# Altium schematic symbol library jlcpcb_2025_04_capacitors_extended_0603.schlib: 3668 symbols (part 8 of 20) (continued)
## CC0603CRNPO9BN2R0
designator C?  Capacitance: 2pF  (hidden comment: *)
Capacitor, Ceramic (MLCC), 2pF, 50V, NP0, SMD 0603; Manufacturer: YAGEO; Manufacturer Part Number: CC0603CRNPO9BN2R0; Package Size: 0603; JLCPCB Basic Part: No; JLCPCB Part Number: C309462; Supplier 1: LCSC; Category: Capacitors - MLCC; Supplier Part Number 1: C309462; Voltage Rating: 50V; Temperature Coefficient: NP0; RoHS: Yes; ComponentLink1Description: Datasheet; ComponentLink1URL: https://wmsc.lcsc.com/wmsc/upload/file/pdf/v2/lcsc/2304140030_YAGEO-CC0603CRNPO9BN2R0_C309462.pdf; ComponentLink2Description: JLCPCB Part URL; ComponentLink2URL: https://jlcpcb.com/partdetail/C309462; ComponentLink3Description: LCSC Part URL; ComponentLink3URL: https://lcsc.com/product-detail/Multilayer-Ceramic-Capacitors-MLCC---SMD-SMT_YAGEO-YAGEO-CC0603CRNPO9BN2R0_C309462.html
footprint CAP-0603 (0603 (1608M) Capacitor)
pins: 1, 2

## CC0603CRNPO9BN2R2
designator C?  Capacitance: 2.2pF  (hidden comment: *)
Capacitor, Ceramic (MLCC), 2.2pF, 50V, NP0, SMD 0603; Manufacturer: YAGEO; Manufacturer Part Number: CC0603CRNPO9BN2R2; Package Size: 0603; JLCPCB Basic Part: No; JLCPCB Part Number: C282246; Supplier 1: LCSC; Category: Capacitors - MLCC; Supplier Part Number 1: C282246; Voltage Rating: 50V; Temperature Coefficient: NP0; RoHS: Yes; ComponentLink1Description: Datasheet; ComponentLink1URL: https://wmsc.lcsc.com/wmsc/upload/file/pdf/v2/lcsc/2304140030_YAGEO-CC0603CRNPO9BN2R2_C282246.pdf; ComponentLink2Description: JLCPCB Part URL; ComponentLink2URL: https://jlcpcb.com/partdetail/C282246; ComponentLink3Description: LCSC Part URL; ComponentLink3URL: https://lcsc.com/product-detail/Multilayer-Ceramic-Capacitors-MLCC---SMD-SMT_YAGEO-YAGEO-CC0603CRNPO9BN2R2_C282246.html
footprint CAP-0603 (0603 (1608M) Capacitor)
pins: 1, 2

## CC0603CRNPO9BN2R4
designator C?  Capacitance: 2.4pF  (hidden comment: *)
Capacitor, Ceramic (MLCC), 2.4pF, 50V, NP0, SMD 0603; Manufacturer: YAGEO; Manufacturer Part Number: CC0603CRNPO9BN2R4; Package Size: 0603; JLCPCB Basic Part: No; JLCPCB Part Number: C513705; Supplier 1: LCSC; Category: Capacitors - MLCC; Supplier Part Number 1: C513705; Voltage Rating: 50V; Temperature Coefficient: NP0; RoHS: Yes; ComponentLink1Description: Datasheet; ComponentLink1URL: https://wmsc.lcsc.com/wmsc/upload/file/pdf/v2/lcsc/2004231434_YAGEO-CC0603CRNPO9BN2R4_C513705.pdf; ComponentLink2Description: JLCPCB Part URL; ComponentLink2URL: https://jlcpcb.com/partdetail/C513705; ComponentLink3Description: LCSC Part URL; ComponentLink3URL: https://lcsc.com/product-detail/Multilayer-Ceramic-Capacitors-MLCC---SMD-SMT_YAGEO-YAGEO-CC0603CRNPO9BN2R4_C513705.html
footprint CAP-0603 (0603 (1608M) Capacitor)
pins: 1, 2

## CC0603CRNPO9BN2R5
designator C?  Capacitance: 2.5pF  (hidden comment: *)
Capacitor, Ceramic (MLCC), 2.5pF, 50V, NP0, SMD 0603; Manufacturer: YAGEO; Manufacturer Part Number: CC0603CRNPO9BN2R5; Package Size: 0603; JLCPCB Basic Part: No; JLCPCB Part Number: C327232; Supplier 1: LCSC; Category: Capacitors - MLCC; Supplier Part Number 1: C327232; Voltage Rating: 50V; Temperature Coefficient: NP0; RoHS: Yes; ComponentLink1Description: Datasheet; ComponentLink1URL: https://wmsc.lcsc.com/wmsc/upload/file/pdf/v2/lcsc/1811141242_YAGEO-CC0603CRNPO9BN2R5_C327232.pdf; ComponentLink2Description: JLCPCB Part URL; ComponentLink2URL: https://jlcpcb.com/partdetail/C327232; ComponentLink3Description: LCSC Part URL; ComponentLink3URL: https://lcsc.com/product-detail/Multilayer-Ceramic-Capacitors-MLCC---SMD-SMT_YAGEO-YAGEO-CC0603CRNPO9BN2R5_C327232.html
footprint CAP-0603 (0603 (1608M) Capacitor)
pins: 1, 2

## CC0603CRNPO9BN2R7
designator C?  Capacitance: 2.7pF  (hidden comment: *)
Capacitor, Ceramic (MLCC), 2.7pF, 50V, NP0, SMD 0603; Manufacturer: YAGEO; Manufacturer Part Number: CC0603CRNPO9BN2R7; Package Size: 0603; JLCPCB Basic Part: No; JLCPCB Part Number: C282247; Supplier 1: LCSC; Category: Capacitors - MLCC; Supplier Part Number 1: C282247; Voltage Rating: 50V; Temperature Coefficient: NP0; RoHS: Yes; ComponentLink1Description: Datasheet; ComponentLink1URL: https://wmsc.lcsc.com/wmsc/upload/file/pdf/v2/lcsc/2304140030_YAGEO-CC0603CRNPO9BN2R7_C282247.pdf; ComponentLink2Description: JLCPCB Part URL; ComponentLink2URL: https://jlcpcb.com/partdetail/C282247; ComponentLink3Description: LCSC Part URL; ComponentLink3URL: https://lcsc.com/product-detail/Multilayer-Ceramic-Capacitors-MLCC---SMD-SMT_YAGEO-YAGEO-CC0603CRNPO9BN2R7_C282247.html
footprint CAP-0603 (0603 (1608M) Capacitor)
pins: 1, 2

## CC0603CRNPO9BN3R0
designator C?  Capacitance: 3pF  (hidden comment: *)
Capacitor, Ceramic (MLCC), 3pF, 50V, NP0, SMD 0603; Manufacturer: YAGEO; Manufacturer Part Number: CC0603CRNPO9BN3R0; Package Size: 0603; JLCPCB Basic Part: No; JLCPCB Part Number: C282068; Supplier 1: LCSC; Category: Capacitors - MLCC; Supplier Part Number 1: C282068; Voltage Rating: 50V; Temperature Coefficient: NP0; RoHS: Yes; ComponentLink1Description: Datasheet; ComponentLink1URL: https://wmsc.lcsc.com/wmsc/upload/file/pdf/v2/lcsc/2304140030_YAGEO-CC0603CRNPO9BN3R0_C282068.pdf; ComponentLink2Description: JLCPCB Part URL; ComponentLink2URL: https://jlcpcb.com/partdetail/C282068; ComponentLink3Description: LCSC Part URL; ComponentLink3URL: https://lcsc.com/product-detail/Multilayer-Ceramic-Capacitors-MLCC---SMD-SMT_YAGEO-YAGEO-CC0603CRNPO9BN3R0_C282068.html
footprint CAP-0603 (0603 (1608M) Capacitor)
pins: 1, 2

## CC0603CRNPO9BN3R3
designator C?  Capacitance: 3.3pF  (hidden comment: *)
Capacitor, Ceramic (MLCC), 3.3pF, 50V, NP0, SMD 0603; Manufacturer: YAGEO; Manufacturer Part Number: CC0603CRNPO9BN3R3; Package Size: 0603; JLCPCB Basic Part: No; JLCPCB Part Number: C282249; Supplier 1: LCSC; Category: Capacitors - MLCC; Supplier Part Number 1: C282249; Voltage Rating: 50V; Temperature Coefficient: NP0; RoHS: Yes; ComponentLink1Description: Datasheet; ComponentLink1URL: https://wmsc.lcsc.com/wmsc/upload/file/pdf/v2/lcsc/2304140030_YAGEO-CC0603CRNPO9BN3R3_C282249.pdf; ComponentLink2Description: JLCPCB Part URL; ComponentLink2URL: https://jlcpcb.com/partdetail/C282249; ComponentLink3Description: LCSC Part URL; ComponentLink3URL: https://lcsc.com/product-detail/Multilayer-Ceramic-Capacitors-MLCC---SMD-SMT_YAGEO-YAGEO-CC0603CRNPO9BN3R3_C282249.html
footprint CAP-0603 (0603 (1608M) Capacitor)
pins: 1, 2

## CC0603CRNPO9BN3R5
designator C?  Capacitance: 3.5pF  (hidden comment: *)
Capacitor, Ceramic (MLCC), 3.5pF, 50V, NP0, SMD 0603; Manufacturer: YAGEO; Manufacturer Part Number: CC0603CRNPO9BN3R5; Package Size: 0603; JLCPCB Basic Part: No; JLCPCB Part Number: C519374; Supplier 1: LCSC; Category: Capacitors - MLCC; Supplier Part Number 1: C519374; Voltage Rating: 50V; Temperature Coefficient: NP0; RoHS: Yes; ComponentLink1Description: Datasheet; ComponentLink1URL: https://wmsc.lcsc.com/wmsc/upload/file/pdf/v2/lcsc/2006011834_YAGEO-CC0603CRNPO9BN3R5_C519374.pdf; ComponentLink2Description: JLCPCB Part URL; ComponentLink2URL: https://jlcpcb.com/partdetail/C519374; ComponentLink3Description: LCSC Part URL; ComponentLink3URL: https://lcsc.com/product-detail/Multilayer-Ceramic-Capacitors-MLCC---SMD-SMT_YAGEO-YAGEO-CC0603CRNPO9BN3R5_C519374.html
footprint CAP-0603 (0603 (1608M) Capacitor)
pins: 1, 2

## CC0603CRNPO9BN3R6
designator C?  Capacitance: 3.6pF  (hidden comment: *)
Capacitor, Ceramic (MLCC), 3.6pF, 50V, NP0, SMD 0603; Manufacturer: YAGEO; Manufacturer Part Number: CC0603CRNPO9BN3R6; Package Size: 0603; JLCPCB Basic Part: No; JLCPCB Part Number: C309463; Supplier 1: LCSC; Category: Capacitors - MLCC; Supplier Part Number 1: C309463; Voltage Rating: 50V; Temperature Coefficient: NP0; RoHS: Yes; ComponentLink1Description: Datasheet; ComponentLink1URL: https://wmsc.lcsc.com/wmsc/upload/file/pdf/v2/lcsc/2304140030_YAGEO-CC0603CRNPO9BN3R6_C309463.pdf; ComponentLink2Description: JLCPCB Part URL; ComponentLink2URL: https://jlcpcb.com/partdetail/C309463; ComponentLink3Description: LCSC Part URL; ComponentLink3URL: https://lcsc.com/product-detail/Multilayer-Ceramic-Capacitors-MLCC---SMD-SMT_YAGEO-YAGEO-CC0603CRNPO9BN3R6_C309463.html
footprint CAP-0603 (0603 (1608M) Capacitor)
pins: 1, 2

## CC0603CRNPO9BN3R9
designator C?  Capacitance: 3.9pF  (hidden comment: *)
Capacitor, Ceramic (MLCC), 3.9pF, 50V, NP0, SMD 0603; Manufacturer: YAGEO; Manufacturer Part Number: CC0603CRNPO9BN3R9; Package Size: 0603; JLCPCB Basic Part: No; JLCPCB Part Number: C282250; Supplier 1: LCSC; Category: Capacitors - MLCC; Supplier Part Number 1: C282250; Voltage Rating: 50V; Temperature Coefficient: NP0; RoHS: Yes; ComponentLink1Description: Datasheet; ComponentLink1URL: https://wmsc.lcsc.com/wmsc/upload/file/pdf/v2/lcsc/2304140030_YAGEO-CC0603CRNPO9BN3R9_C282250.pdf; ComponentLink2Description: JLCPCB Part URL; ComponentLink2URL: https://jlcpcb.com/partdetail/C282250; ComponentLink3Description: LCSC Part URL; ComponentLink3URL: https://lcsc.com/product-detail/Multilayer-Ceramic-Capacitors-MLCC---SMD-SMT_YAGEO-YAGEO-CC0603CRNPO9BN3R9_C282250.html
footprint CAP-0603 (0603 (1608M) Capacitor)
pins: 1, 2

## CC0603CRNPO9BN4R0
designator C?  Capacitance: 4pF  (hidden comment: *)
Capacitor, Ceramic (MLCC), 4pF, 50V, NP0, SMD 0603; Manufacturer: YAGEO; Manufacturer Part Number: CC0603CRNPO9BN4R0; Package Size: 0603; JLCPCB Basic Part: No; JLCPCB Part Number: C130123; Supplier 1: LCSC; Category: Capacitors - MLCC; Supplier Part Number 1: C130123; Voltage Rating: 50V; Temperature Coefficient: NP0; RoHS: Yes; ComponentLink1Description: Datasheet; ComponentLink1URL: https://wmsc.lcsc.com/wmsc/upload/file/pdf/v2/lcsc/2304140030_YAGEO-CC0603CRNPO9BN4R0_C130123.pdf; ComponentLink2Description: JLCPCB Part URL; ComponentLink2URL: https://jlcpcb.com/partdetail/C130123; ComponentLink3Description: LCSC Part URL; ComponentLink3URL: https://lcsc.com/product-detail/Multilayer-Ceramic-Capacitors-MLCC---SMD-SMT_YAGEO-YAGEO-CC0603CRNPO9BN4R0_C130123.html
footprint CAP-0603 (0603 (1608M) Capacitor)
pins: 1, 2

## CC0603CRNPO9BN4R3
designator C?  Capacitance: 4.3pF  (hidden comment: *)
Capacitor, Ceramic (MLCC), 4.3pF, 50V, NP0, SMD 0603; Manufacturer: YAGEO; Manufacturer Part Number: CC0603CRNPO9BN4R3; Package Size: 0603; JLCPCB Basic Part: No; JLCPCB Part Number: C519375; Supplier 1: LCSC; Category: Capacitors - MLCC; Supplier Part Number 1: C519375; Voltage Rating: 50V; Temperature Coefficient: NP0; RoHS: Yes; ComponentLink1Description: Datasheet; ComponentLink1URL: https://wmsc.lcsc.com/wmsc/upload/file/pdf/v2/lcsc/2008031233_YAGEO-CC0603CRNPO9BN4R3_C519375.pdf; ComponentLink2Description: JLCPCB Part URL; ComponentLink2URL: https://jlcpcb.com/partdetail/C519375; ComponentLink3Description: LCSC Part URL; ComponentLink3URL: https://lcsc.com/product-detail/Multilayer-Ceramic-Capacitors-MLCC---SMD-SMT_YAGEO-YAGEO-CC0603CRNPO9BN4R3_C519375.html
footprint CAP-0603 (0603 (1608M) Capacitor)
pins: 1, 2

## CC0603CRNPO9BN4R7
designator C?  Capacitance: 4.7pF  (hidden comment: *)
Capacitor, Ceramic (MLCC), 4.7pF, 50V, NP0, SMD 0603; Manufacturer: YAGEO; Manufacturer Part Number: CC0603CRNPO9BN4R7; Package Size: 0603; JLCPCB Basic Part: No; JLCPCB Part Number: C282071; Supplier 1: LCSC; Category: Capacitors - MLCC; Supplier Part Number 1: C282071; Voltage Rating: 50V; Temperature Coefficient: NP0; RoHS: Yes; ComponentLink1Description: Datasheet; ComponentLink1URL: https://wmsc.lcsc.com/wmsc/upload/file/pdf/v2/lcsc/2304140030_YAGEO-CC0603CRNPO9BN4R7_C282071.pdf; ComponentLink2Description: JLCPCB Part URL; ComponentLink2URL: https://jlcpcb.com/partdetail/C282071; ComponentLink3Description: LCSC Part URL; ComponentLink3URL: https://lcsc.com/product-detail/Multilayer-Ceramic-Capacitors-MLCC---SMD-SMT_YAGEO-YAGEO-CC0603CRNPO9BN4R7_C282071.html
footprint CAP-0603 (0603 (1608M) Capacitor)
pins: 1, 2

## CC0603CRNPO9BN5R0
designator C?  Capacitance: 5pF  (hidden comment: *)
Capacitor, Ceramic (MLCC), 5pF, 50V, NP0, SMD 0603; Manufacturer: YAGEO; Manufacturer Part Number: CC0603CRNPO9BN5R0; Package Size: 0603; JLCPCB Basic Part: No; JLCPCB Part Number: C327203; Supplier 1: LCSC; Category: Capacitors - MLCC; Supplier Part Number 1: C327203; Voltage Rating: 50V; Temperature Coefficient: NP0; RoHS: Yes; ComponentLink1Description: Datasheet; ComponentLink1URL: https://wmsc.lcsc.com/wmsc/upload/file/pdf/v2/lcsc/1811141233_YAGEO-CC0603CRNPO9BN5R0_C327203.pdf; ComponentLink2Description: JLCPCB Part URL; ComponentLink2URL: https://jlcpcb.com/partdetail/C327203; ComponentLink3Description: LCSC Part URL; ComponentLink3URL: https://lcsc.com/product-detail/Multilayer-Ceramic-Capacitors-MLCC---SMD-SMT_YAGEO-YAGEO-CC0603CRNPO9BN5R0_C327203.html
footprint CAP-0603 (0603 (1608M) Capacitor)
pins: 1, 2

## CC0603CRNPO9BN5R1
designator C?  Capacitance: 5.1pF  (hidden comment: *)
Capacitor, Ceramic (MLCC), 5.1pF, 50V, NP0, SMD 0603; Manufacturer: YAGEO; Manufacturer Part Number: CC0603CRNPO9BN5R1; Package Size: 0603; JLCPCB Basic Part: No; JLCPCB Part Number: C519376; Supplier 1: LCSC; Category: Capacitors - MLCC; Supplier Part Number 1: C519376; Voltage Rating: 50V; Temperature Coefficient: NP0; RoHS: Yes; ComponentLink1Description: Datasheet; ComponentLink1URL: https://wmsc.lcsc.com/wmsc/upload/file/pdf/v2/lcsc/2005141203_YAGEO-CC0603CRNPO9BN5R1_C519376.pdf; ComponentLink2Description: JLCPCB Part URL; ComponentLink2URL: https://jlcpcb.com/partdetail/C519376; ComponentLink3Description: LCSC Part URL; ComponentLink3URL: https://lcsc.com/product-detail/Multilayer-Ceramic-Capacitors-MLCC---SMD-SMT_YAGEO-YAGEO-CC0603CRNPO9BN5R1_C519376.html
footprint CAP-0603 (0603 (1608M) Capacitor)
pins: 1, 2

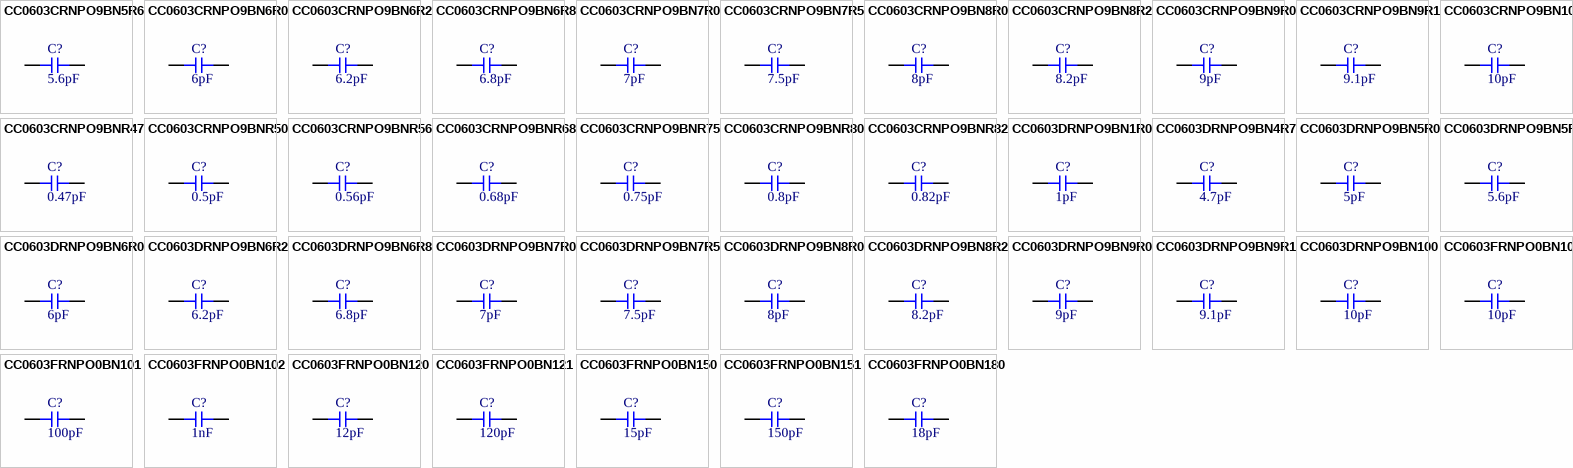
[diagram p35: symbols CC0603CRNPO9BN5R6 to CC0603FRNPO0BN180]

## CC0603CRNPO9BN5R6
designator C?  Capacitance: 5.6pF  (hidden comment: *)
Capacitor, Ceramic (MLCC), 5.6pF, 50V, NP0, SMD 0603; Manufacturer: YAGEO; Manufacturer Part Number: CC0603CRNPO9BN5R6; Package Size: 0603; JLCPCB Basic Part: No; JLCPCB Part Number: C309464; Supplier 1: LCSC; Category: Capacitors - MLCC; Supplier Part Number 1: C309464; Voltage Rating: 50V; Temperature Coefficient: NP0; RoHS: Yes; ComponentLink1Description: Datasheet; ComponentLink1URL: https://wmsc.lcsc.com/wmsc/upload/file/pdf/v2/lcsc/2304140030_YAGEO-CC0603CRNPO9BN5R6_C309464.pdf; ComponentLink2Description: JLCPCB Part URL; ComponentLink2URL: https://jlcpcb.com/partdetail/C309464; ComponentLink3Description: LCSC Part URL; ComponentLink3URL: https://lcsc.com/product-detail/Multilayer-Ceramic-Capacitors-MLCC---SMD-SMT_YAGEO-YAGEO-CC0603CRNPO9BN5R6_C309464.html
footprint CAP-0603 (0603 (1608M) Capacitor)
pins: 1, 2

## CC0603CRNPO9BN6R0
designator C?  Capacitance: 6pF  (hidden comment: *)
Capacitor, Ceramic (MLCC), 6pF, 50V, NP0, SMD 0603; Manufacturer: YAGEO; Manufacturer Part Number: CC0603CRNPO9BN6R0; Package Size: 0603; JLCPCB Basic Part: No; JLCPCB Part Number: C130125; Supplier 1: LCSC; Category: Capacitors - MLCC; Supplier Part Number 1: C130125; Voltage Rating: 50V; Temperature Coefficient: NP0; RoHS: Yes; ComponentLink1Description: Datasheet; ComponentLink1URL: https://wmsc.lcsc.com/wmsc/upload/file/pdf/v2/lcsc/2304140030_YAGEO-CC0603CRNPO9BN6R0_C130125.pdf; ComponentLink2Description: JLCPCB Part URL; ComponentLink2URL: https://jlcpcb.com/partdetail/C130125; ComponentLink3Description: LCSC Part URL; ComponentLink3URL: https://lcsc.com/product-detail/Multilayer-Ceramic-Capacitors-MLCC---SMD-SMT_YAGEO-YAGEO-CC0603CRNPO9BN6R0_C130125.html
footprint CAP-0603 (0603 (1608M) Capacitor)
pins: 1, 2

## CC0603CRNPO9BN6R2
designator C?  Capacitance: 6.2pF  (hidden comment: *)
Capacitor, Ceramic (MLCC), 6.2pF, 50V, NP0, SMD 0603; Manufacturer: YAGEO; Manufacturer Part Number: CC0603CRNPO9BN6R2; Package Size: 0603; JLCPCB Basic Part: No; JLCPCB Part Number: C327317; Supplier 1: LCSC; Category: Capacitors - MLCC; Supplier Part Number 1: C327317; Voltage Rating: 50V; Temperature Coefficient: NP0; RoHS: Yes; ComponentLink1Description: Datasheet; ComponentLink1URL: https://wmsc.lcsc.com/wmsc/upload/file/pdf/v2/lcsc/1811141225_YAGEO-CC0603CRNPO9BN6R2_C327317.pdf; ComponentLink2Description: JLCPCB Part URL; ComponentLink2URL: https://jlcpcb.com/partdetail/C327317; ComponentLink3Description: LCSC Part URL; ComponentLink3URL: https://lcsc.com/product-detail/Multilayer-Ceramic-Capacitors-MLCC---SMD-SMT_YAGEO-YAGEO-CC0603CRNPO9BN6R2_C327317.html
footprint CAP-0603 (0603 (1608M) Capacitor)
pins: 1, 2

## CC0603CRNPO9BN6R8
designator C?  Capacitance: 6.8pF  (hidden comment: *)
Capacitor, Ceramic (MLCC), 6.8pF, 50V, NP0, SMD 0603; Manufacturer: YAGEO; Manufacturer Part Number: CC0603CRNPO9BN6R8; Package Size: 0603; JLCPCB Basic Part: No; JLCPCB Part Number: C282251; Supplier 1: LCSC; Category: Capacitors - MLCC; Supplier Part Number 1: C282251; Voltage Rating: 50V; Temperature Coefficient: NP0; RoHS: Yes; ComponentLink1Description: Datasheet; ComponentLink1URL: https://wmsc.lcsc.com/wmsc/upload/file/pdf/v2/lcsc/2304140030_YAGEO-CC0603CRNPO9BN6R8_C282251.pdf; ComponentLink2Description: JLCPCB Part URL; ComponentLink2URL: https://jlcpcb.com/partdetail/C282251; ComponentLink3Description: LCSC Part URL; ComponentLink3URL: https://lcsc.com/product-detail/Multilayer-Ceramic-Capacitors-MLCC---SMD-SMT_YAGEO-YAGEO-CC0603CRNPO9BN6R8_C282251.html
footprint CAP-0603 (0603 (1608M) Capacitor)
pins: 1, 2

## CC0603CRNPO9BN7R0
designator C?  Capacitance: 7pF  (hidden comment: *)
Capacitor, Ceramic (MLCC), 7pF, 50V, NP0, SMD 0603; Manufacturer: YAGEO; Manufacturer Part Number: CC0603CRNPO9BN7R0; Package Size: 0603; JLCPCB Basic Part: No; JLCPCB Part Number: C326971; Supplier 1: LCSC; Category: Capacitors - MLCC; Supplier Part Number 1: C326971; Voltage Rating: 50V; Temperature Coefficient: NP0; RoHS: Yes; ComponentLink1Description: Datasheet; ComponentLink1URL: https://wmsc.lcsc.com/wmsc/upload/file/pdf/v2/lcsc/1811141234_YAGEO-CC0603CRNPO9BN7R0_C326971.pdf; ComponentLink2Description: JLCPCB Part URL; ComponentLink2URL: https://jlcpcb.com/partdetail/C326971; ComponentLink3Description: LCSC Part URL; ComponentLink3URL: https://lcsc.com/product-detail/Multilayer-Ceramic-Capacitors-MLCC---SMD-SMT_YAGEO-YAGEO-CC0603CRNPO9BN7R0_C326971.html
footprint CAP-0603 (0603 (1608M) Capacitor)
pins: 1, 2

## CC0603CRNPO9BN7R5
designator C?  Capacitance: 7.5pF  (hidden comment: *)
Capacitor, Ceramic (MLCC), 7.5pF, 50V, NP0, SMD 0603; Manufacturer: YAGEO; Manufacturer Part Number: CC0603CRNPO9BN7R5; Package Size: 0603; JLCPCB Basic Part: No; JLCPCB Part Number: C519377; Supplier 1: LCSC; Category: Capacitors - MLCC; Supplier Part Number 1: C519377; Voltage Rating: 50V; Temperature Coefficient: NP0; RoHS: Yes; ComponentLink1Description: Datasheet; ComponentLink1URL: https://wmsc.lcsc.com/wmsc/upload/file/pdf/v2/lcsc/2006011834_YAGEO-CC0603CRNPO9BN7R5_C519377.pdf; ComponentLink2Description: JLCPCB Part URL; ComponentLink2URL: https://jlcpcb.com/partdetail/C519377; ComponentLink3Description: LCSC Part URL; ComponentLink3URL: https://lcsc.com/product-detail/Multilayer-Ceramic-Capacitors-MLCC---SMD-SMT_YAGEO-YAGEO-CC0603CRNPO9BN7R5_C519377.html
footprint CAP-0603 (0603 (1608M) Capacitor)
pins: 1, 2

## CC0603CRNPO9BN8R0
designator C?  Capacitance: 8pF  (hidden comment: *)
Capacitor, Ceramic (MLCC), 8pF, 50V, NP0, SMD 0603; Manufacturer: YAGEO; Manufacturer Part Number: CC0603CRNPO9BN8R0; Package Size: 0603; JLCPCB Basic Part: No; JLCPCB Part Number: C327316; Supplier 1: LCSC; Category: Capacitors - MLCC; Supplier Part Number 1: C327316; Voltage Rating: 50V; Temperature Coefficient: NP0; RoHS: Yes; ComponentLink1Description: Datasheet; ComponentLink1URL: https://wmsc.lcsc.com/wmsc/upload/file/pdf/v2/lcsc/1811141242_YAGEO-CC0603CRNPO9BN8R0_C327316.pdf; ComponentLink2Description: JLCPCB Part URL; ComponentLink2URL: https://jlcpcb.com/partdetail/C327316; ComponentLink3Description: LCSC Part URL; ComponentLink3URL: https://lcsc.com/product-detail/Multilayer-Ceramic-Capacitors-MLCC---SMD-SMT_YAGEO-YAGEO-CC0603CRNPO9BN8R0_C327316.html
footprint CAP-0603 (0603 (1608M) Capacitor)
pins: 1, 2

## CC0603CRNPO9BN8R2
designator C?  Capacitance: 8.2pF  (hidden comment: *)
Capacitor, Ceramic (MLCC), 8.2pF, 50V, NP0, SMD 0603; Manufacturer: YAGEO; Manufacturer Part Number: CC0603CRNPO9BN8R2; Package Size: 0603; JLCPCB Basic Part: No; JLCPCB Part Number: C277519; Supplier 1: LCSC; Category: Capacitors - MLCC; Supplier Part Number 1: C277519; Voltage Rating: 50V; Temperature Coefficient: NP0; RoHS: Yes; ComponentLink1Description: Datasheet; ComponentLink1URL: https://wmsc.lcsc.com/wmsc/upload/file/pdf/v2/lcsc/2304140030_YAGEO-CC0603CRNPO9BN8R2_C277519.pdf; ComponentLink2Description: JLCPCB Part URL; ComponentLink2URL: https://jlcpcb.com/partdetail/C277519; ComponentLink3Description: LCSC Part URL; ComponentLink3URL: https://lcsc.com/product-detail/Multilayer-Ceramic-Capacitors-MLCC---SMD-SMT_YAGEO-YAGEO-CC0603CRNPO9BN8R2_C277519.html
footprint CAP-0603 (0603 (1608M) Capacitor)
pins: 1, 2

## CC0603CRNPO9BN9R0
designator C?  Capacitance: 9pF  (hidden comment: *)
Capacitor, Ceramic (MLCC), 9pF, 50V, NP0, SMD 0603; Manufacturer: YAGEO; Manufacturer Part Number: CC0603CRNPO9BN9R0; Package Size: 0603; JLCPCB Basic Part: No; JLCPCB Part Number: C282076; Supplier 1: LCSC; Category: Capacitors - MLCC; Supplier Part Number 1: C282076; Voltage Rating: 50V; Temperature Coefficient: NP0; RoHS: Yes; ComponentLink1Description: Datasheet; ComponentLink1URL: https://wmsc.lcsc.com/wmsc/upload/file/pdf/v2/lcsc/2304140030_YAGEO-CC0603CRNPO9BN9R0_C282076.pdf; ComponentLink2Description: JLCPCB Part URL; ComponentLink2URL: https://jlcpcb.com/partdetail/C282076; ComponentLink3Description: LCSC Part URL; ComponentLink3URL: https://lcsc.com/product-detail/Multilayer-Ceramic-Capacitors-MLCC---SMD-SMT_YAGEO-YAGEO-CC0603CRNPO9BN9R0_C282076.html
footprint CAP-0603 (0603 (1608M) Capacitor)
pins: 1, 2

## CC0603CRNPO9BN9R1
designator C?  Capacitance: 9.1pF  (hidden comment: *)
Capacitor, Ceramic (MLCC), 9.1pF, 50V, NP0, SMD 0603; Manufacturer: YAGEO; Manufacturer Part Number: CC0603CRNPO9BN9R1; Package Size: 0603; JLCPCB Basic Part: No; JLCPCB Part Number: C513588; Supplier 1: LCSC; Category: Capacitors - MLCC; Supplier Part Number 1: C513588; Voltage Rating: 50V; Temperature Coefficient: NP0; RoHS: Yes; ComponentLink1Description: Datasheet; ComponentLink1URL: https://wmsc.lcsc.com/wmsc/upload/file/pdf/v2/lcsc/2004231433_YAGEO-CC0603CRNPO9BN9R1_C513588.pdf; ComponentLink2Description: JLCPCB Part URL; ComponentLink2URL: https://jlcpcb.com/partdetail/C513588; ComponentLink3Description: LCSC Part URL; ComponentLink3URL: https://lcsc.com/product-detail/Multilayer-Ceramic-Capacitors-MLCC---SMD-SMT_YAGEO-YAGEO-CC0603CRNPO9BN9R1_C513588.html
footprint CAP-0603 (0603 (1608M) Capacitor)
pins: 1, 2

## CC0603CRNPO9BN100
designator C?  Capacitance: 10pF  (hidden comment: *)
Capacitor, Ceramic (MLCC), 10pF, 50V, NP0, SMD 0603; Manufacturer: YAGEO; Manufacturer Part Number: CC0603CRNPO9BN100; Package Size: 0603; JLCPCB Basic Part: No; JLCPCB Part Number: C513561; Supplier 1: LCSC; Category: Capacitors - MLCC; Supplier Part Number 1: C513561; Voltage Rating: 50V; Temperature Coefficient: NP0; RoHS: Yes; ComponentLink1Description: Datasheet; ComponentLink1URL: https://wmsc.lcsc.com/wmsc/upload/file/pdf/v2/lcsc/2202251630_YAGEO-CC0603CRNPO9BN100_C513561.pdf; ComponentLink2Description: JLCPCB Part URL; ComponentLink2URL: https://jlcpcb.com/partdetail/C513561; ComponentLink3Description: LCSC Part URL; ComponentLink3URL: https://lcsc.com/product-detail/Multilayer-Ceramic-Capacitors-MLCC---SMD-SMT_YAGEO-YAGEO-CC0603CRNPO9BN100_C513561.html
footprint CAP-0603 (0603 (1608M) Capacitor)
pins: 1, 2

## CC0603CRNPO9BNR47
designator C?  Capacitance: 0.47pF  (hidden comment: *)
Capacitor, Ceramic (MLCC), 0.47pF, 50V, NP0, SMD 0603; Manufacturer: YAGEO; Manufacturer Part Number: CC0603CRNPO9BNR47; Package Size: 0603; JLCPCB Basic Part: No; JLCPCB Part Number: C519378; Supplier 1: LCSC; Category: Capacitors - MLCC; Supplier Part Number 1: C519378; Voltage Rating: 50V; Temperature Coefficient: NP0; RoHS: Yes; ComponentLink1Description: Datasheet; ComponentLink1URL: https://wmsc.lcsc.com/wmsc/upload/file/pdf/v2/lcsc/2006011834_YAGEO-CC0603CRNPO9BNR47_C519378.pdf; ComponentLink2Description: JLCPCB Part URL; ComponentLink2URL: https://jlcpcb.com/partdetail/C519378; ComponentLink3Description: LCSC Part URL; ComponentLink3URL: https://lcsc.com/product-detail/Multilayer-Ceramic-Capacitors-MLCC---SMD-SMT_YAGEO-YAGEO-CC0603CRNPO9BNR47_C519378.html
footprint CAP-0603 (0603 (1608M) Capacitor)
pins: 1, 2

## CC0603CRNPO9BNR50
designator C?  Capacitance: 0.5pF  (hidden comment: *)
Capacitor, Ceramic (MLCC), 0.5pF, 50V, NP0, SMD 0603; Manufacturer: YAGEO; Manufacturer Part Number: CC0603CRNPO9BNR50; Package Size: 0603; JLCPCB Basic Part: No; JLCPCB Part Number: C134255; Supplier 1: LCSC; Category: Capacitors - MLCC; Supplier Part Number 1: C134255; Voltage Rating: 50V; Temperature Coefficient: NP0; RoHS: Yes; ComponentLink1Description: Datasheet; ComponentLink1URL: https://wmsc.lcsc.com/wmsc/upload/file/pdf/v2/lcsc/2304140030_YAGEO-CC0603CRNPO9BNR50_C134255.pdf; ComponentLink2Description: JLCPCB Part URL; ComponentLink2URL: https://jlcpcb.com/partdetail/C134255; ComponentLink3Description: LCSC Part URL; ComponentLink3URL: https://lcsc.com/product-detail/Multilayer-Ceramic-Capacitors-MLCC---SMD-SMT_YAGEO-YAGEO-CC0603CRNPO9BNR50_C134255.html
footprint CAP-0603 (0603 (1608M) Capacitor)
pins: 1, 2

## CC0603CRNPO9BNR56
designator C?  Capacitance: 0.56pF  (hidden comment: *)
Capacitor, Ceramic (MLCC), 0.56pF, 50V, NP0, SMD 0603; Manufacturer: YAGEO; Manufacturer Part Number: CC0603CRNPO9BNR56; Package Size: 0603; JLCPCB Basic Part: No; JLCPCB Part Number: C519379; Supplier 1: LCSC; Category: Capacitors - MLCC; Supplier Part Number 1: C519379; Voltage Rating: 50V; Temperature Coefficient: NP0; RoHS: Yes; ComponentLink1Description: Datasheet; ComponentLink1URL: https://wmsc.lcsc.com/wmsc/upload/file/pdf/v2/lcsc/2006011834_YAGEO-CC0603CRNPO9BNR56_C519379.pdf; ComponentLink2Description: JLCPCB Part URL; ComponentLink2URL: https://jlcpcb.com/partdetail/C519379; ComponentLink3Description: LCSC Part URL; ComponentLink3URL: https://lcsc.com/product-detail/Multilayer-Ceramic-Capacitors-MLCC---SMD-SMT_YAGEO-YAGEO-CC0603CRNPO9BNR56_C519379.html
footprint CAP-0603 (0603 (1608M) Capacitor)
pins: 1, 2

## CC0603CRNPO9BNR68
designator C?  Capacitance: 0.68pF  (hidden comment: *)
Capacitor, Ceramic (MLCC), 0.68pF, 50V, NP0, SMD 0603; Manufacturer: YAGEO; Manufacturer Part Number: CC0603CRNPO9BNR68; Package Size: 0603; JLCPCB Basic Part: No; JLCPCB Part Number: C519380; Supplier 1: LCSC; Category: Capacitors - MLCC; Supplier Part Number 1: C519380; Voltage Rating: 50V; Temperature Coefficient: NP0; RoHS: Yes; ComponentLink1Description: Datasheet; ComponentLink1URL: https://wmsc.lcsc.com/wmsc/upload/file/pdf/v2/lcsc/2007231533_YAGEO-CC0603CRNPO9BNR68_C519380.pdf; ComponentLink2Description: JLCPCB Part URL; ComponentLink2URL: https://jlcpcb.com/partdetail/C519380; ComponentLink3Description: LCSC Part URL; ComponentLink3URL: https://lcsc.com/product-detail/Multilayer-Ceramic-Capacitors-MLCC---SMD-SMT_YAGEO-YAGEO-CC0603CRNPO9BNR68_C519380.html
footprint CAP-0603 (0603 (1608M) Capacitor)
pins: 1, 2

## CC0603CRNPO9BNR75
designator C?  Capacitance: 0.75pF  (hidden comment: *)
Capacitor, Ceramic (MLCC), 0.75pF, 50V, NP0, SMD 0603; Manufacturer: YAGEO; Manufacturer Part Number: CC0603CRNPO9BNR75; Package Size: 0603; JLCPCB Basic Part: No; JLCPCB Part Number: C309465; Supplier 1: LCSC; Category: Capacitors - MLCC; Supplier Part Number 1: C309465; Voltage Rating: 50V; Temperature Coefficient: NP0; RoHS: Yes; ComponentLink1Description: Datasheet; ComponentLink1URL: https://wmsc.lcsc.com/wmsc/upload/file/pdf/v2/lcsc/2304140030_YAGEO-CC0603CRNPO9BNR75_C309465.pdf; ComponentLink2Description: JLCPCB Part URL; ComponentLink2URL: https://jlcpcb.com/partdetail/C309465; ComponentLink3Description: LCSC Part URL; ComponentLink3URL: https://lcsc.com/product-detail/Multilayer-Ceramic-Capacitors-MLCC---SMD-SMT_YAGEO-YAGEO-CC0603CRNPO9BNR75_C309465.html
footprint CAP-0603 (0603 (1608M) Capacitor)
pins: 1, 2

## CC0603CRNPO9BNR80
designator C?  Capacitance: 0.8pF  (hidden comment: *)
Capacitor, Ceramic (MLCC), 0.8pF, 50V, NP0, SMD 0603; Manufacturer: YAGEO; Manufacturer Part Number: CC0603CRNPO9BNR80; Package Size: 0603; JLCPCB Basic Part: No; JLCPCB Part Number: C327165; Supplier 1: LCSC; Category: Capacitors - MLCC; Supplier Part Number 1: C327165; Voltage Rating: 50V; Temperature Coefficient: NP0; RoHS: Yes; ComponentLink1Description: Datasheet; ComponentLink1URL: https://wmsc.lcsc.com/wmsc/upload/file/pdf/v2/lcsc/1811141233_YAGEO-CC0603CRNPO9BNR80_C327165.pdf; ComponentLink2Description: JLCPCB Part URL; ComponentLink2URL: https://jlcpcb.com/partdetail/C327165; ComponentLink3Description: LCSC Part URL; ComponentLink3URL: https://lcsc.com/product-detail/Multilayer-Ceramic-Capacitors-MLCC---SMD-SMT_YAGEO-YAGEO-CC0603CRNPO9BNR80_C327165.html
footprint CAP-0603 (0603 (1608M) Capacitor)
pins: 1, 2

## CC0603CRNPO9BNR82
designator C?  Capacitance: 0.82pF  (hidden comment: *)
Capacitor, Ceramic (MLCC), 0.82pF, 50V, NP0, SMD 0603; Manufacturer: YAGEO; Manufacturer Part Number: CC0603CRNPO9BNR82; Package Size: 0603; JLCPCB Basic Part: No; JLCPCB Part Number: C519381; Supplier 1: LCSC; Category: Capacitors - MLCC; Supplier Part Number 1: C519381; Voltage Rating: 50V; Temperature Coefficient: NP0; RoHS: Yes; ComponentLink1Description: Datasheet; ComponentLink1URL: https://wmsc.lcsc.com/wmsc/upload/file/pdf/v2/lcsc/2005181834_YAGEO-CC0603CRNPO9BNR82_C519381.pdf; ComponentLink2Description: JLCPCB Part URL; ComponentLink2URL: https://jlcpcb.com/partdetail/C519381; ComponentLink3Description: LCSC Part URL; ComponentLink3URL: https://lcsc.com/product-detail/Multilayer-Ceramic-Capacitors-MLCC---SMD-SMT_YAGEO-YAGEO-CC0603CRNPO9BNR82_C519381.html
footprint CAP-0603 (0603 (1608M) Capacitor)
pins: 1, 2

## CC0603DRNPO9BN1R0
designator C?  Capacitance: 1pF  (hidden comment: *)
Capacitor, Ceramic (MLCC), 1pF, 50V, NP0, SMD 0603; Manufacturer: YAGEO; Manufacturer Part Number: CC0603DRNPO9BN1R0; Package Size: 0603; JLCPCB Basic Part: No; JLCPCB Part Number: C2187537; Supplier 1: LCSC; Category: Capacitors - MLCC; Supplier Part Number 1: C2187537; Voltage Rating: 50V; Temperature Coefficient: NP0; RoHS: Yes; ComponentLink1Description: Datasheet; ComponentLink1URL: https://wmsc.lcsc.com/wmsc/upload/file/pdf/v2/lcsc/2202041700_YAGEO-CC0603DRNPO9BN1R0_C2187537.pdf; ComponentLink2Description: JLCPCB Part URL; ComponentLink2URL: https://jlcpcb.com/partdetail/C2187537; ComponentLink3Description: LCSC Part URL; ComponentLink3URL: https://lcsc.com/product-detail/Multilayer-Ceramic-Capacitors-MLCC---SMD-SMT_YAGEO-YAGEO-CC0603DRNPO9BN1R0_C2187537.html
footprint CAP-0603 (0603 (1608M) Capacitor)
pins: 1, 2

## CC0603DRNPO9BN4R7
designator C?  Capacitance: 4.7pF  (hidden comment: *)
Capacitor, Ceramic (MLCC), 4.7pF, 50V, NP0, SMD 0603; Manufacturer: YAGEO; Manufacturer Part Number: CC0603DRNPO9BN4R7; Package Size: 0603; JLCPCB Basic Part: No; JLCPCB Part Number: C519382; Supplier 1: LCSC; Category: Capacitors - MLCC; Supplier Part Number 1: C519382; Voltage Rating: 50V; Temperature Coefficient: NP0; RoHS: Yes; ComponentLink1Description: Datasheet; ComponentLink1URL: https://wmsc.lcsc.com/wmsc/upload/file/pdf/v2/lcsc/2006011834_YAGEO-CC0603DRNPO9BN4R7_C519382.pdf; ComponentLink2Description: JLCPCB Part URL; ComponentLink2URL: https://jlcpcb.com/partdetail/C519382; ComponentLink3Description: LCSC Part URL; ComponentLink3URL: https://lcsc.com/product-detail/Multilayer-Ceramic-Capacitors-MLCC---SMD-SMT_YAGEO-YAGEO-CC0603DRNPO9BN4R7_C519382.html
footprint CAP-0603 (0603 (1608M) Capacitor)
pins: 1, 2

## CC0603DRNPO9BN5R0
designator C?  Capacitance: 5pF  (hidden comment: *)
Capacitor, Ceramic (MLCC), 5pF, 50V, NP0, SMD 0603; Manufacturer: YAGEO; Manufacturer Part Number: CC0603DRNPO9BN5R0; Package Size: 0603; JLCPCB Basic Part: No; JLCPCB Part Number: C309466; Supplier 1: LCSC; Category: Capacitors - MLCC; Supplier Part Number 1: C309466; Voltage Rating: 50V; Temperature Coefficient: NP0; RoHS: Yes; ComponentLink1Description: Datasheet; ComponentLink1URL: https://wmsc.lcsc.com/wmsc/upload/file/pdf/v2/lcsc/2304140030_YAGEO-CC0603DRNPO9BN5R0_C309466.pdf; ComponentLink2Description: JLCPCB Part URL; ComponentLink2URL: https://jlcpcb.com/partdetail/C309466; ComponentLink3Description: LCSC Part URL; ComponentLink3URL: https://lcsc.com/product-detail/Multilayer-Ceramic-Capacitors-MLCC---SMD-SMT_YAGEO-YAGEO-CC0603DRNPO9BN5R0_C309466.html
footprint CAP-0603 (0603 (1608M) Capacitor)
pins: 1, 2

## CC0603DRNPO9BN5R6
designator C?  Capacitance: 5.6pF  (hidden comment: *)
Capacitor, Ceramic (MLCC), 5.6pF, 50V, SMD 0603; Manufacturer: YAGEO; Manufacturer Part Number: CC0603DRNPO9BN5R6; Package Size: 0603; JLCPCB Basic Part: No; JLCPCB Part Number: C327284; Supplier 1: LCSC; Category: Capacitors - MLCC; Supplier Part Number 1: C327284; Voltage Rating: 50V; RoHS: Yes; ComponentLink1Description: Datasheet; ComponentLink1URL: https://wmsc.lcsc.com/wmsc/upload/file/pdf/v2/lcsc/1811141233_YAGEO-CC0603DRNPO9BN5R6_C327284.pdf; ComponentLink2Description: JLCPCB Part URL; ComponentLink2URL: https://jlcpcb.com/partdetail/C327284; ComponentLink3Description: LCSC Part URL; ComponentLink3URL: https://lcsc.com/product-detail/Multilayer-Ceramic-Capacitors-MLCC---SMD-SMT_YAGEO-YAGEO-CC0603DRNPO9BN5R6_C327284.html
footprint CAP-0603 (0603 (1608M) Capacitor)
pins: 1, 2

## CC0603DRNPO9BN6R0
designator C?  Capacitance: 6pF  (hidden comment: *)
Capacitor, Ceramic (MLCC), 6pF, 50V, NP0, SMD 0603; Manufacturer: YAGEO; Manufacturer Part Number: CC0603DRNPO9BN6R0; Package Size: 0603; JLCPCB Basic Part: No; JLCPCB Part Number: C326972; Supplier 1: LCSC; Category: Capacitors - MLCC; Supplier Part Number 1: C326972; Voltage Rating: 50V; Temperature Coefficient: NP0; RoHS: Yes; ComponentLink1Description: Datasheet; ComponentLink1URL: https://wmsc.lcsc.com/wmsc/upload/file/pdf/v2/lcsc/1811091621_YAGEO-CC0603DRNPO9BN6R0_C326972.pdf; ComponentLink2Description: JLCPCB Part URL; ComponentLink2URL: https://jlcpcb.com/partdetail/C326972; ComponentLink3Description: LCSC Part URL; ComponentLink3URL: https://lcsc.com/product-detail/Multilayer-Ceramic-Capacitors-MLCC---SMD-SMT_YAGEO-YAGEO-CC0603DRNPO9BN6R0_C326972.html
footprint CAP-0603 (0603 (1608M) Capacitor)
pins: 1, 2

## CC0603DRNPO9BN6R2
designator C?  Capacitance: 6.2pF  (hidden comment: *)
Capacitor, Ceramic (MLCC), 6.2pF, 50V, NP0, SMD 0603; Manufacturer: YAGEO; Manufacturer Part Number: CC0603DRNPO9BN6R2; Package Size: 0603; JLCPCB Basic Part: No; JLCPCB Part Number: C519383; Supplier 1: LCSC; Category: Capacitors - MLCC; Supplier Part Number 1: C519383; Voltage Rating: 50V; Temperature Coefficient: NP0; RoHS: Yes; ComponentLink1Description: Datasheet; ComponentLink1URL: https://wmsc.lcsc.com/wmsc/upload/file/pdf/v2/lcsc/2007231533_YAGEO-CC0603DRNPO9BN6R2_C519383.pdf; ComponentLink2Description: JLCPCB Part URL; ComponentLink2URL: https://jlcpcb.com/partdetail/C519383; ComponentLink3Description: LCSC Part URL; ComponentLink3URL: https://lcsc.com/product-detail/Multilayer-Ceramic-Capacitors-MLCC---SMD-SMT_YAGEO-YAGEO-CC0603DRNPO9BN6R2_C519383.html
footprint CAP-0603 (0603 (1608M) Capacitor)
pins: 1, 2

## CC0603DRNPO9BN6R8
designator C?  Capacitance: 6.8pF  (hidden comment: *)
Capacitor, Ceramic (MLCC), 6.8pF, 50V, NP0, SMD 0603; Manufacturer: YAGEO; Manufacturer Part Number: CC0603DRNPO9BN6R8; Package Size: 0603; JLCPCB Basic Part: No; JLCPCB Part Number: C327268; Supplier 1: LCSC; Category: Capacitors - MLCC; Supplier Part Number 1: C327268; Voltage Rating: 50V; Temperature Coefficient: NP0; RoHS: Yes; ComponentLink1Description: Datasheet; ComponentLink1URL: https://wmsc.lcsc.com/wmsc/upload/file/pdf/v2/lcsc/1811141243_YAGEO-CC0603DRNPO9BN6R8_C327268.pdf; ComponentLink2Description: JLCPCB Part URL; ComponentLink2URL: https://jlcpcb.com/partdetail/C327268; ComponentLink3Description: LCSC Part URL; ComponentLink3URL: https://lcsc.com/product-detail/Multilayer-Ceramic-Capacitors-MLCC---SMD-SMT_YAGEO-YAGEO-CC0603DRNPO9BN6R8_C327268.html
footprint CAP-0603 (0603 (1608M) Capacitor)
pins: 1, 2

## CC0603DRNPO9BN7R0
designator C?  Capacitance: 7pF  (hidden comment: *)
Capacitor, Ceramic (MLCC), 7pF, 50V, SMD 0603; Manufacturer: YAGEO; Manufacturer Part Number: CC0603DRNPO9BN7R0; Package Size: 0603; JLCPCB Basic Part: No; JLCPCB Part Number: C513583; Supplier 1: LCSC; Category: Capacitors - MLCC; Supplier Part Number 1: C513583; Voltage Rating: 50V; RoHS: Yes; ComponentLink1Description: Datasheet; ComponentLink1URL: https://wmsc.lcsc.com/wmsc/upload/file/pdf/v2/lcsc/2004231432_YAGEO-CC0603DRNPO9BN7R0_C513583.pdf; ComponentLink2Description: JLCPCB Part URL; ComponentLink2URL: https://jlcpcb.com/partdetail/C513583; ComponentLink3Description: LCSC Part URL; ComponentLink3URL: https://lcsc.com/product-detail/Multilayer-Ceramic-Capacitors-MLCC---SMD-SMT_YAGEO-YAGEO-CC0603DRNPO9BN7R0_C513583.html
footprint CAP-0603 (0603 (1608M) Capacitor)
pins: 1, 2

## CC0603DRNPO9BN7R5
designator C?  Capacitance: 7.5pF  (hidden comment: *)
Capacitor, Ceramic (MLCC), 7.5pF, 50V, NP0, SMD 0603; Manufacturer: YAGEO; Manufacturer Part Number: CC0603DRNPO9BN7R5; Package Size: 0603; JLCPCB Basic Part: No; JLCPCB Part Number: C519384; Supplier 1: LCSC; Category: Capacitors - MLCC; Supplier Part Number 1: C519384; Voltage Rating: 50V; Temperature Coefficient: NP0; RoHS: Yes; ComponentLink1Description: Datasheet; ComponentLink1URL: https://wmsc.lcsc.com/wmsc/upload/file/pdf/v2/lcsc/2006011834_YAGEO-CC0603DRNPO9BN7R5_C519384.pdf; ComponentLink2Description: JLCPCB Part URL; ComponentLink2URL: https://jlcpcb.com/partdetail/C519384; ComponentLink3Description: LCSC Part URL; ComponentLink3URL: https://lcsc.com/product-detail/Multilayer-Ceramic-Capacitors-MLCC---SMD-SMT_YAGEO-YAGEO-CC0603DRNPO9BN7R5_C519384.html
footprint CAP-0603 (0603 (1608M) Capacitor)
pins: 1, 2

## CC0603DRNPO9BN8R0
designator C?  Capacitance: 8pF  (hidden comment: *)
Capacitor, Ceramic (MLCC), 8pF, 50V, NP0, SMD 0603; Manufacturer: YAGEO; Manufacturer Part Number: CC0603DRNPO9BN8R0; Package Size: 0603; JLCPCB Basic Part: No; JLCPCB Part Number: C326970; Supplier 1: LCSC; Category: Capacitors - MLCC; Supplier Part Number 1: C326970; Voltage Rating: 50V; Temperature Coefficient: NP0; RoHS: Yes; ComponentLink1Description: Datasheet; ComponentLink1URL: https://wmsc.lcsc.com/wmsc/upload/file/pdf/v2/lcsc/1811141225_YAGEO-CC0603DRNPO9BN8R0_C326970.pdf; ComponentLink2Description: JLCPCB Part URL; ComponentLink2URL: https://jlcpcb.com/partdetail/C326970; ComponentLink3Description: LCSC Part URL; ComponentLink3URL: https://lcsc.com/product-detail/Multilayer-Ceramic-Capacitors-MLCC---SMD-SMT_YAGEO-YAGEO-CC0603DRNPO9BN8R0_C326970.html
footprint CAP-0603 (0603 (1608M) Capacitor)
pins: 1, 2

## CC0603DRNPO9BN8R2
designator C?  Capacitance: 8.2pF  (hidden comment: *)
Capacitor, Ceramic (MLCC), 8.2pF, 50V, NP0, SMD 0603; Manufacturer: YAGEO; Manufacturer Part Number: CC0603DRNPO9BN8R2; Package Size: 0603; JLCPCB Basic Part: No; JLCPCB Part Number: C513624; Supplier 1: LCSC; Category: Capacitors - MLCC; Supplier Part Number 1: C513624; Voltage Rating: 50V; Temperature Coefficient: NP0; RoHS: Yes; ComponentLink1Description: Datasheet; ComponentLink1URL: https://wmsc.lcsc.com/wmsc/upload/file/pdf/v2/lcsc/2004231433_YAGEO-CC0603DRNPO9BN8R2_C513624.pdf; ComponentLink2Description: JLCPCB Part URL; ComponentLink2URL: https://jlcpcb.com/partdetail/C513624; ComponentLink3Description: LCSC Part URL; ComponentLink3URL: https://lcsc.com/product-detail/Multilayer-Ceramic-Capacitors-MLCC---SMD-SMT_YAGEO-YAGEO-CC0603DRNPO9BN8R2_C513624.html
footprint CAP-0603 (0603 (1608M) Capacitor)
pins: 1, 2

## CC0603DRNPO9BN9R0
designator C?  Capacitance: 9pF  (hidden comment: *)
Capacitor, Ceramic (MLCC), 9pF, 50V, NP0, SMD 0603; Manufacturer: YAGEO; Manufacturer Part Number: CC0603DRNPO9BN9R0; Package Size: 0603; JLCPCB Basic Part: No; JLCPCB Part Number: C513579; Supplier 1: LCSC; Category: Capacitors - MLCC; Supplier Part Number 1: C513579; Voltage Rating: 50V; Temperature Coefficient: NP0; RoHS: Yes; ComponentLink1Description: Datasheet; ComponentLink1URL: https://wmsc.lcsc.com/wmsc/upload/file/pdf/v2/lcsc/2004231432_YAGEO-CC0603DRNPO9BN9R0_C513579.pdf; ComponentLink2Description: JLCPCB Part URL; ComponentLink2URL: https://jlcpcb.com/partdetail/C513579; ComponentLink3Description: LCSC Part URL; ComponentLink3URL: https://lcsc.com/product-detail/Multilayer-Ceramic-Capacitors-MLCC---SMD-SMT_YAGEO-YAGEO-CC0603DRNPO9BN9R0_C513579.html
footprint CAP-0603 (0603 (1608M) Capacitor)
pins: 1, 2

## CC0603DRNPO9BN9R1
designator C?  Capacitance: 9.1pF  (hidden comment: *)
Capacitor, Ceramic (MLCC), 9.1pF, 50V, NP0, SMD 0603; Manufacturer: YAGEO; Manufacturer Part Number: CC0603DRNPO9BN9R1; Package Size: 0603; JLCPCB Basic Part: No; JLCPCB Part Number: C519385; Supplier 1: LCSC; Category: Capacitors - MLCC; Supplier Part Number 1: C519385; Voltage Rating: 50V; Temperature Coefficient: NP0; RoHS: Yes; ComponentLink1Description: Datasheet; ComponentLink1URL: https://wmsc.lcsc.com/wmsc/upload/file/pdf/v2/lcsc/2010251433_YAGEO-CC0603DRNPO9BN9R1_C519385.pdf; ComponentLink2Description: JLCPCB Part URL; ComponentLink2URL: https://jlcpcb.com/partdetail/C519385; ComponentLink3Description: LCSC Part URL; ComponentLink3URL: https://lcsc.com/product-detail/Multilayer-Ceramic-Capacitors-MLCC---SMD-SMT_YAGEO-YAGEO-CC0603DRNPO9BN9R1_C519385.html
footprint CAP-0603 (0603 (1608M) Capacitor)
pins: 1, 2

## CC0603DRNPO9BN100
designator C?  Capacitance: 10pF  (hidden comment: *)
Capacitor, Ceramic (MLCC), 10pF, 50V, NP0, SMD 0603; Manufacturer: YAGEO; Manufacturer Part Number: CC0603DRNPO9BN100; Package Size: 0603; JLCPCB Basic Part: No; JLCPCB Part Number: C281766; Supplier 1: LCSC; Category: Capacitors - MLCC; Supplier Part Number 1: C281766; Voltage Rating: 50V; Temperature Coefficient: NP0; RoHS: Yes; ComponentLink1Description: Datasheet; ComponentLink1URL: https://wmsc.lcsc.com/wmsc/upload/file/pdf/v2/lcsc/2304140030_YAGEO-CC0603DRNPO9BN100_C281766.pdf; ComponentLink2Description: JLCPCB Part URL; ComponentLink2URL: https://jlcpcb.com/partdetail/C281766; ComponentLink3Description: LCSC Part URL; ComponentLink3URL: https://lcsc.com/product-detail/Multilayer-Ceramic-Capacitors-MLCC---SMD-SMT_YAGEO-YAGEO-CC0603DRNPO9BN100_C281766.html
footprint CAP-0603 (0603 (1608M) Capacitor)
pins: 1, 2

## CC0603FRNPO0BN100
designator C?  Capacitance: 10pF  (hidden comment: *)
Capacitor, Ceramic (MLCC), 10pF, ±1%, 100V, NP0, ±1%, SMD 0603; Manufacturer: YAGEO; Manufacturer Part Number: CC0603FRNPO0BN100; Package Size: 0603; JLCPCB Basic Part: No; JLCPCB Part Number: C576764; Supplier 1: LCSC; Category: Capacitors - MLCC; Supplier Part Number 1: C576764; Tolerance: ±1%; Voltage Rating: 100V; Temperature Coefficient: NP0; RoHS: Yes; ComponentLink1Description: Datasheet; ComponentLink1URL: https://wmsc.lcsc.com/wmsc/upload/file/pdf/v2/lcsc/2304202230_YAGEO-CC0603FRNPO0BN100_C576764.pdf; ComponentLink2Description: JLCPCB Part URL; ComponentLink2URL: https://jlcpcb.com/partdetail/C576764; ComponentLink3Description: LCSC Part URL; ComponentLink3URL: https://lcsc.com/product-detail/Multilayer-Ceramic-Capacitors-MLCC---SMD-SMT_YAGEO-YAGEO-CC0603FRNPO0BN100_C576764.html
footprint CAP-0603 (0603 (1608M) Capacitor)
pins: 1, 2

## CC0603FRNPO0BN101
designator C?  Capacitance: 100pF  (hidden comment: *)
Capacitor, Ceramic (MLCC), 100pF, ±1%, 100V, NP0, ±1%, SMD 0603; Manufacturer: YAGEO; Manufacturer Part Number: CC0603FRNPO0BN101; Package Size: 0603; JLCPCB Basic Part: No; JLCPCB Part Number: C527039; Supplier 1: LCSC; Category: Capacitors - MLCC; Supplier Part Number 1: C527039; Tolerance: ±1%; Voltage Rating: 100V; Temperature Coefficient: NP0; RoHS: Yes; ComponentLink1Description: Datasheet; ComponentLink1URL: https://wmsc.lcsc.com/wmsc/upload/file/pdf/v2/lcsc/2006241834_YAGEO-CC0603FRNPO0BN101_C527039.pdf; ComponentLink2Description: JLCPCB Part URL; ComponentLink2URL: https://jlcpcb.com/partdetail/C527039; ComponentLink3Description: LCSC Part URL; ComponentLink3URL: https://lcsc.com/product-detail/Multilayer-Ceramic-Capacitors-MLCC---SMD-SMT_YAGEO-YAGEO-CC0603FRNPO0BN101_C527039.html
footprint CAP-0603 (0603 (1608M) Capacitor)
pins: 1, 2

## CC0603FRNPO0BN102
designator C?  Capacitance: 1nF  (hidden comment: *)
Capacitor, Ceramic (MLCC), 1nF, ±1%, 100V, NP0, ±1%, SMD 0603; Manufacturer: YAGEO; Manufacturer Part Number: CC0603FRNPO0BN102; Package Size: 0603; JLCPCB Basic Part: No; JLCPCB Part Number: C576765; Supplier 1: LCSC; Category: Capacitors - MLCC; Supplier Part Number 1: C576765; Tolerance: ±1%; Voltage Rating: 100V; Temperature Coefficient: NP0; RoHS: Yes; ComponentLink1Description: Datasheet; ComponentLink1URL: https://wmsc.lcsc.com/wmsc/upload/file/pdf/v2/lcsc/2209291730_YAGEO-CC0603FRNPO0BN102_C576765.pdf; ComponentLink2Description: JLCPCB Part URL; ComponentLink2URL: https://jlcpcb.com/partdetail/C576765; ComponentLink3Description: LCSC Part URL; ComponentLink3URL: https://lcsc.com/product-detail/Multilayer-Ceramic-Capacitors-MLCC---SMD-SMT_YAGEO-YAGEO-CC0603FRNPO0BN102_C576765.html
footprint CAP-0603 (0603 (1608M) Capacitor)
pins: 1, 2
